# Altium footprint library Integrated Circuits.PcbLib: 142 footprints (part 3 of 9)
Each footprint in its own frame and in the unit in brackets; x right, y up, seen from the top. Pads: shape width x height; smd on the part's side, far side on the other; paste and mask are expansions set on the pad; w line width, h text height; cw(c..) or ccw(c..) is an arc to the next point about the centre after c.
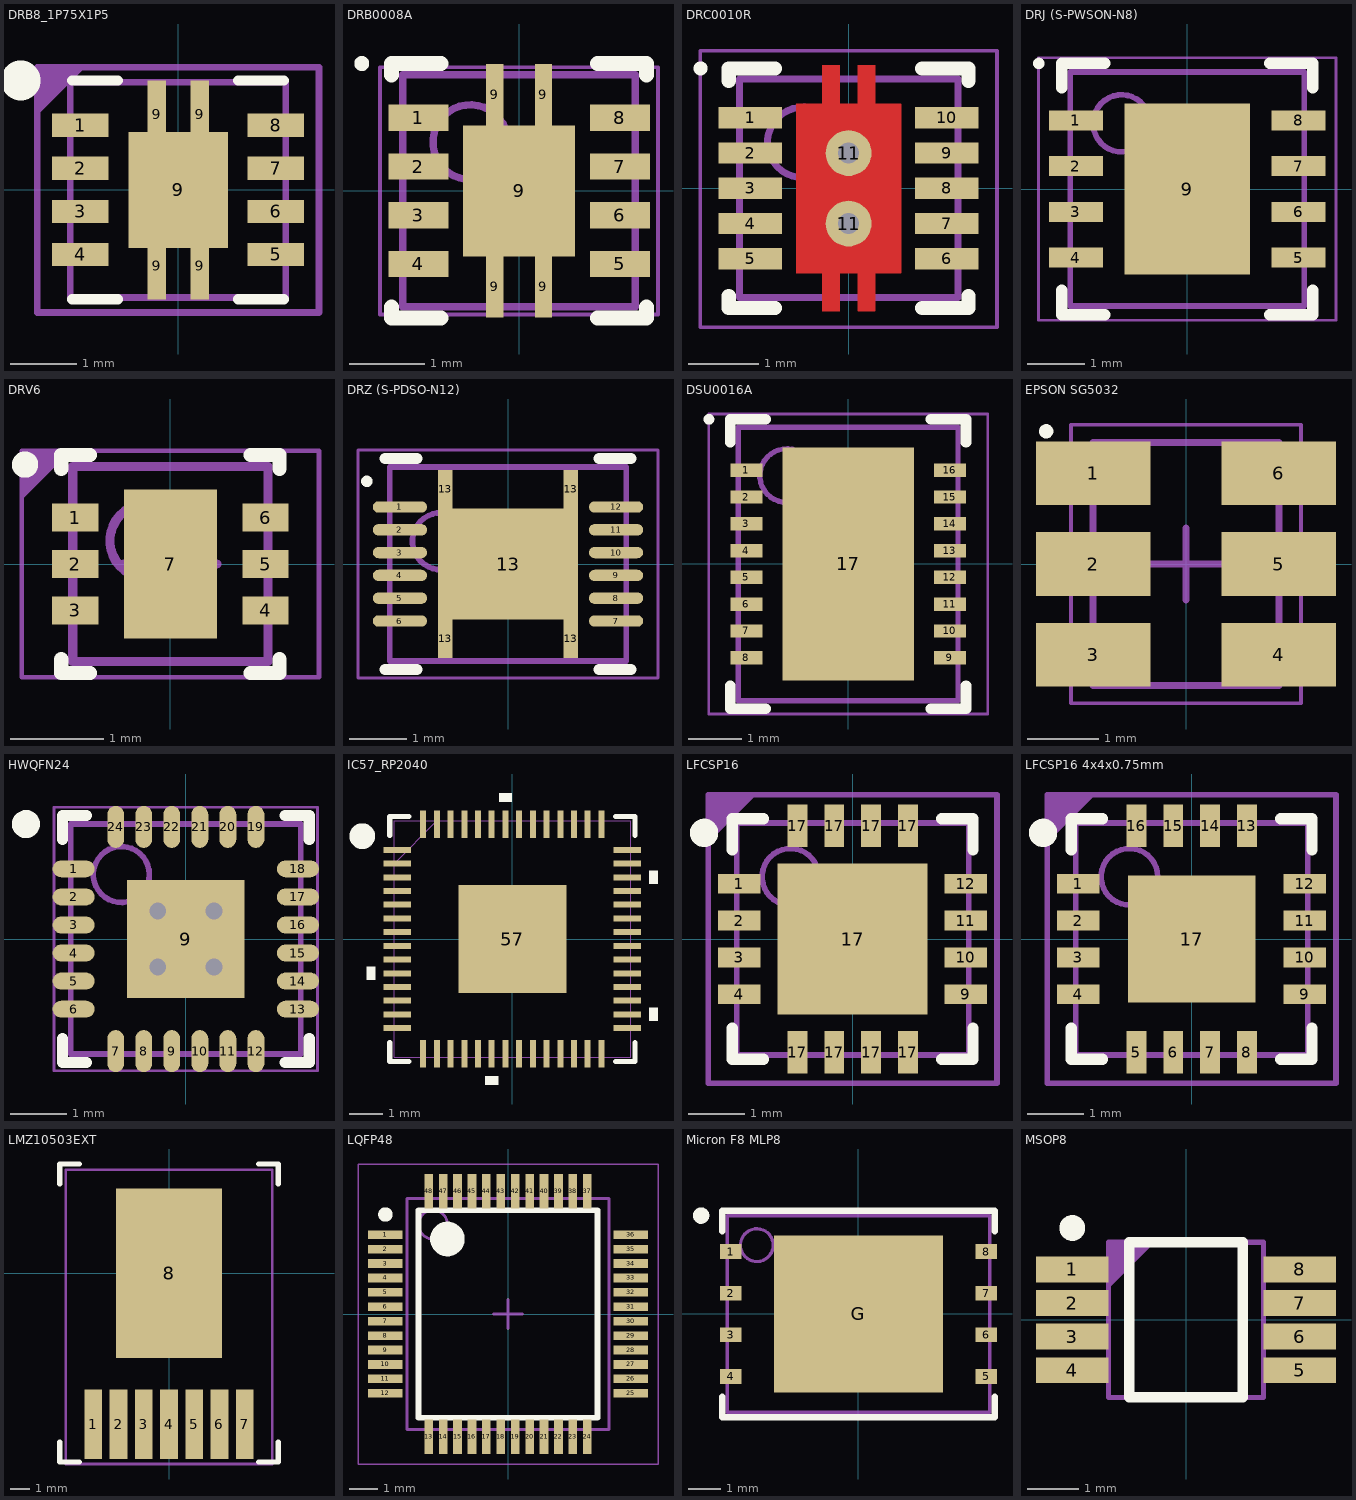
[diagram p2: the footprints below, top view; thin cyan lines are the x and y axes]

## DRB8_1P75X1P5 [mm]
pads (13):
  rect 0.85x0.35 smd: 1(-1.475,0.975) 2(-1.475,0.325) 3(-1.475,-0.325) 4(-1.475,-0.975) 5(1.475,-0.975) 6(1.475,-0.325) 7(1.475,0.325) 8(1.475,0.975)
  rect 0.28x1.016 smd: 9(-0.325,-1.143) 9(-0.325,1.143) 9(0.325,-1.143) 9(0.325,1.143)
  rect 1.5x1.75 smd paste-0.862: 9(0,0)
Top Layer:
  region: 0,-0.875
  region: 0,0.875
Top Overlay:
  circle w0.55: c-2.375,1.65 r0.025
  lines w0.152: -1.6,-1.65 -0.905,-1.65 ; -1.6,1.65 -0.905,1.65 ; 0.905,-1.65 1.6,-1.65 ; 0.905,1.65 1.6,1.65
Top Paste:
  region: 0.675,-0.494 0.241,-0.494 0.1,-0.635 0.1,-0.8 0.675,-0.8
  region: 0.675,0.294 0.241,0.294 0.1,0.152 0.1,-0.152 0.241,-0.294 0.675,-0.294
  region: 0.675,0.8 0.1,0.8 0.1,0.635 0.241,0.494 0.675,0.494
  region: -0.241,-0.494 -0.675,-0.494 -0.675,-0.8 -0.1,-0.8 -0.1,-0.635
  region: -0.241,0.294 -0.675,0.294 -0.675,-0.294 -0.241,-0.294 -0.1,-0.152 -0.1,0.152
  region: -0.1,0.8 -0.675,0.8 -0.675,0.494 -0.241,0.494 -0.1,0.635
  region: 0,-0.875
  region: 0,0.875
Top Solder:
  region: 0,-0.875
  region: 0,0.875
Top Assy Drawing:
  region: -2.125,1.125 -1.375,1.875 -2.125,1.875
  text ".Designator" at -1.956,-0.279 h0.38
3D Bodies:
  lines w0.1: -1.625,-1.625 1.625,-1.625 1.625,1.625 -1.625,1.625 -1.625,-1.625
Mechanical 15:
  lines w0.1: -2.125,-1.85 2.125,-1.85 2.125,1.85 -2.125,1.85 -2.125,-1.85
3D body "QFN65P300X300X100_HS-13N.step": height 1, standoff 0, extent -1.625,-1.625 1.625,1.625

## DRB0008A [mm] "VSON - 1 mm max height"
height 1
pads (13):
  rect 0.8x0.35 smd: 1(-1.345,0.975) 2(-1.345,0.325) 3(-1.345,-0.325) 4(-1.345,-0.975) 5(1.345,-0.975) 6(1.345,-0.325) 7(1.345,0.325) 8(1.345,0.975)
  rect 0.23x0.825 smd: 9(-0.325,-1.28) 9(-0.325,1.28) 9(0.325,-1.28) 9(0.325,1.28)
  rect 1.49x1.75 smd: 9(0,0)
Top Overlay:
  circle w0.1: c-2.1,1.7 r0.05
  lines w0.2: -1.7,-1.55 -1.7,-1.7 -1.045,-1.7 ; -1.7,1.55 -1.7,1.7 -1.045,1.7 ; 1.045,-1.7 1.7,-1.7 1.7,-1.55 ; 1.045,1.7 1.7,1.7 1.7,1.55
3D Bodies:
  circle w0.1: c-0.65,0.65 r0.5
  lines w0.1: -1.55,-1.55 1.55,-1.55 1.55,1.55 -1.55,1.55 -1.55,-1.55
Mechanical 15:
  lines w0.05: -1.855,-1.65 1.855,-1.65 1.855,1.65 -1.855,1.65 -1.855,-1.65
  lines w0.1: -0.5,0 0.5,0 ; 0,-0.5 0,0.5
3D body "SON127P600-8N.step": height 1, standoff 0, extent -1.551,-1.55 1.551,1.55

## DRC0010R [mm]
height 1
pads (12):
  rect 0.9x0.3 smd: 1(-1.395,1) 2(-1.395,0.5) 3(-1.395,0) 4(-1.395,-0.5) 5(-1.395,-1) 6(1.395,-1) 7(1.395,-0.5) 8(1.395,0) 9(1.395,0.5) 10(1.395,1)
  round 0.65 / inner round 1.524 / far side round 0.65 hole 0.3 mask-0.203: 11(0,-0.5) 11(0,0.5)
Top Layer:
  region: -0.745,1.198 0.745,1.198 0.745,-1.202 -0.745,-1.202
  region: -0.375,1.742 -0.125,1.742 -0.125,1.197 -0.375,1.197
  region: 0.13,1.742 0.38,1.742 0.38,1.197 0.13,1.197
  region: -0.375,-1.2 -0.125,-1.2 -0.125,-1.745 -0.375,-1.745
  region: 0.13,-1.2 0.38,-1.2 0.38,-1.745 0.13,-1.745
Top Overlay:
  circle w0.1: c-2.1,1.7 r0.05
  lines w0.2: -1.7,-1.525 -1.7,-1.7 -1.045,-1.7 ; -1.7,1.525 -1.7,1.7 -1.045,1.7 ; 1.045,-1.7 1.7,-1.7 1.7,-1.525 ; 1.045,1.7 1.7,1.7 1.7,1.525
3D Bodies:
  circle w0.1: c-0.65,0.65 r0.5
  lines w0.1: -1.55,-1.55 -1.55,1.55 1.55,1.55 1.55,-1.55 -1.55,-1.55
Mechanical 15:
  lines w0.05: -2.105,-1.97 -2.105,1.95 2.105,1.95 2.105,-1.97 -2.105,-1.97
  lines w0.1: -0.5,0 0.5,0 ; 0,-0.5 0,0.5
3D body: height 1, standoff 0, extent -1.55,-1.55 1.55,1.55

## DRJ (S-PWSON-N8) [mm] "SON, 8-Leads, Body 4.00x4.00mm, Pitch 0.80mm, Thermal Pad 3.00x2.20mm, IPC Medium Density"
height 0.8
pads (9):
  rect 0.95x0.35 smd: 1(-1.95,1.2) 2(-1.95,0.4) 3(-1.95,-0.4) 4(-1.95,-1.2) 5(1.95,-1.2) 6(1.95,-0.4) 7(1.95,0.4) 8(1.95,1.2)
  rect 2.2x3 smd paste-1.1: 9(0,0)
Top Overlay:
  circle w0.1: c-2.6,2.2 r0.05
  lines w0.2: -2.2,-1.775 -2.2,-2.2 -1.445,-2.2 ; -2.2,1.775 -2.2,2.2 -1.445,2.2 ; 1.445,-2.2 2.2,-2.2 2.2,-1.775 ; 1.445,2.2 2.2,2.2 2.2,1.775
Top Paste:
  rectangle: -1,0.1 -0.1,1.4
  rectangle: -1,-1.4 -0.1,-0.1
  rectangle: 0.1,0.1 1,1.4
  rectangle: 0.1,-1.4 1,-0.1
3D Bodies:
  circle w0.1: c-1.15,1.15 r0.5
  lines w0.1: -2.05,-2.05 -2.05,2.05 2.05,2.05 2.05,-2.05 -2.05,-2.05
Mechanical 15:
  lines w0.05: -2.605,-2.3 -2.605,2.3 2.605,2.3 2.605,-2.3 -2.605,-2.3
  lines w0.1: -0.5,0 0.5,0 ; 0,-0.5 0,0.5
3D body "DRJ (S-PWSON-N8).step": height 0.8, standoff 0, extent -2.13,-2.05 2.13,2.05

## DRV6 [mm] "QFN, 6-Leads, Body 2.00x2.00mm, Pitch 0.65mm/0.50mm, Thermal Pad 1.00x1.60mm, IPC Medium Density"
height 0.8
pads (7):
  rect 0.5x0.3 smd: 1(-1.024,0.5) 2(-1.024,0) 3(-1.024,-0.5) 4(1.024,-0.5) 5(1.024,0) 6(1.024,0.5)
  rect 1x1.6 smd paste-1.016: 7(0,0)
Top Overlay:
  lines w0.152: -1.499,1.081 ccw(c-1.564,1.07) -1.499,1.067 ; -1.175,-1.025 -1.175,-1.175 -0.864,-1.175 ; -1.175,1.025 -1.175,1.175 -0.864,1.175 ; 0.864,-1.175 1.175,-1.175 1.175,-1.025 ; 0.864,1.175 1.175,1.175 1.175,1.025
Top Paste:
  region: -0.4,0.7 -0.05,0.7 -0.05,0.05 -0.4,0.05
  region: 0.4,-0.7 0.05,-0.7 0.05,-0.05 0.4,-0.05
  region: -0.4,-0.7 -0.05,-0.7 -0.05,-0.05 -0.4,-0.05
  region: 0.4,0.7 0.05,0.7 0.05,0.05 0.4,0.05
Top Assy Drawing:
  region: -1.622,0.668 -1.07,1.219 -1.622,1.219
  lines w0.05: -1.6,-1.219 -1.6,1.219 1.6,1.219 1.6,-1.219 -1.6,-1.219
  lines w0.1: -0.5,0 0.5,0 ; 0,-0.5 0,0.5
  text ".Designator" at -1.956,-0.279 h0.38
Top Dimensions and Assy Info:
  circle w0.1: c-0.25,0.25 r0.4
  lines w0.1: -1.05,-1.05 -1.05,1.05 1.05,1.05 1.05,-1.05 -1.05,-1.05
3D body "QFN50P200X200X80_HS-7N.step": height 0.8, standoff 0, extent -1.1,-1.05 1.1,1.05

## DRZ (S-PDSO-N12) [mm] "SON, 12-Leads, Body 2.50x4.00mm, Pitch 0.40mm, Thermal Pad 2.45x1.95mm, IPC Medium Density"
height 1
pads (17):
  oval 0.95x0.2 smd: 1(-1.895,1) 2(-1.895,0.6) 3(-1.895,0.2) 4(-1.895,-0.2) 5(-1.895,-0.6) 6(-1.895,-1) 7(1.895,-1) 8(1.895,-0.6) 9(1.895,-0.2) 10(1.895,0.2) 11(1.895,0.6) 12(1.895,1)
  rect 0.25x0.675 smd: 13(-1.1,-1.31) 13(-1.1,1.31) 13(1.1,-1.31) 13(1.1,1.31)
  rect 2.45x1.95 smd: 13(0,0)
Top Overlay:
  circle w0.1: c-2.475,1.45 r0.05
  lines w0.2: -2.155,-1.85 -1.6,-1.85 ; -2.155,1.85 -1.6,1.85 ; 1.595,-1.85 2.15,-1.85 ; 1.595,1.85 2.15,1.85
3D Bodies:
  circle w0.1: c-1.175,0.4 r0.5
  lines w0.1: -2.075,-1.7 2.075,-1.7 2.075,1.7 -2.075,1.7 -2.075,-1.7
Mechanical 15:
  lines w0.05: -2.63,-2 2.63,-2 2.63,2 -2.63,2 -2.63,-2
  lines w0.1: -0.5,0 0.5,0 ; 0,-0.5 0,0.5

## DSU0016A [mm] "SON, 16-Leads, Body 5.00x4.00mm, Pitch 0.50mm, Thermal Pad 4.35x2.45mm, IPC Medium Density"
height 1
pads (17):
  rect 0.6x0.25 smd: 1(-1.9,1.75) 2(-1.9,1.25) 3(-1.9,0.75) 4(-1.9,0.25) 5(-1.9,-0.25) 6(-1.9,-0.75) 7(-1.9,-1.25) 8(-1.9,-1.75) 9(1.9,-1.75) 10(1.9,-1.25) 11(1.9,-0.75) 12(1.9,-0.25) 13(1.9,0.25) 14(1.9,0.75) 15(1.9,1.25) 16(1.9,1.75)
  rect 2.45x4.35 smd paste-1.225: 17(0,0)
Top Overlay:
  circle w0.1: c-2.6,2.7 r0.05
  lines w0.2: -2.2,-2.275 -2.2,-2.7 -1.545,-2.7 ; -2.2,2.275 -2.2,2.7 -1.545,2.7 ; 1.545,-2.7 2.2,-2.7 2.2,-2.275 ; 1.545,2.7 2.2,2.7 2.2,2.275
Top Paste:
  rectangle: 0.1,-2.075 1.13,-0.825
  rectangle: 0.1,-0.625 1.13,0.625
  rectangle: 0.1,0.825 1.13,2.075
  rectangle: -1.13,-2.075 -0.1,-0.825
  rectangle: -1.13,-0.625 -0.1,0.625
  rectangle: -1.13,0.825 -0.1,2.075
3D Bodies:
  circle w0.1: c-1.15,1.65 r0.5
  lines w0.1: -2.05,-2.55 2.05,-2.55 2.05,2.55 -2.05,2.55 -2.05,-2.55
Mechanical 15:
  lines w0.05: -2.605,-2.8 2.605,-2.8 2.605,2.8 -2.605,2.8 -2.605,-2.8
  lines w0.1: -0.5,0 0.5,0 ; 0,-0.5 0,0.5
3D body: height 1, standoff 0.05, extent -2.05,-2.55 2.05,2.55

## EPSON SG5032 [mm] "EPSON SG5032 XTAL"
height 1
pads (6):
  rect 1.6x0.89 smd: 1(-1.3,1.27) 2(-1.3,0) 3(-1.3,-1.27) 4(1.3,-1.27) 5(1.3,0) 6(1.3,1.27)
Top Overlay:
  circle w0.1: c-1.957,1.858 r0.05
3D Bodies:
  lines w0.1: -1.3,-1.7 1.3,-1.7 1.3,-1.59 cw(c1.3,-1.27) 1.3,-0.95 1.3,-0.32 cw(c1.3,0) 1.3,0.32 1.3,0.95 cw(c1.3,1.27) 1.3,1.59 1.3,1.7 -1.3,1.7 -1.3,1.59 cw(c-1.3,1.27) -1.3,0.95 -1.3,0.32 cw(c-1.3,0) -1.3,-0.32 -1.3,-0.95 cw(c-1.3,-1.27) -1.3,-1.59 -1.3,-1.7
Mechanical 15:
  lines w0.05: -1.61,-1.95 1.61,-1.95 1.61,1.95 -1.61,1.95 -1.61,-1.95
  lines w0.1: -0.5,0 0.5,0 ; 0,-0.5 0,0.5
3D body "Raltron CL3225 v15.step": height 1.22, standoff 0, extent -1.25,-1.6 1.25,1.6

## HWQFN24 [mm] "QFN, 24-Leads, Body 4.00x4.00mm, Pitch 0.50mm, Thermal Pad 2.10x2.10mm, IPC High Density"
height 0.8
pads (25):
  oval 0.75x0.3 smd: 1(-2,1.25) 2(-2,0.75) 3(-2,0.25) 4(-2,-0.25) 5(-2,-0.75) 6(-2,-1.25) 13(2,-1.25) 14(2,-0.75) 15(2,-0.25) 16(2,0.25) 17(2,0.75) 18(2,1.25)
  oval 0.3x0.75 smd: 7(-1.25,-2) 8(-0.75,-2) 9(-0.25,-2) 10(0.25,-2) 11(0.75,-2) 12(1.25,-2) 19(1.25,2) 20(0.75,2) 21(0.25,2) 22(-0.25,2) 23(-0.75,2) 24(-1.25,2)
  rect 2.1x2.1 smd: 9(0,0)
via 0.5,-0.5 diameter 0.6 hole 0.3
via -0.5,-0.5 diameter 0.6 hole 0.3
via 0.5,0.5 diameter 0.6 hole 0.3
via -0.5,0.5 diameter 0.6 hole 0.3
Top Overlay:
  circle w0.25: c-2.85,2.05 r0.125
  lines w0.2: -2.2,-1.775 -2.2,-2.2 -1.775,-2.2 ; -2.2,1.775 -2.2,2.2 -1.775,2.2 ; 1.775,-2.2 2.2,-2.2 2.2,-1.775 ; 1.775,2.2 2.2,2.2 2.2,1.775
3D Bodies:
  circle w0.1: c-1.15,1.15 r0.5
  lines w0.1: -2.05,-2.05 2.05,-2.05 2.05,2.05 -2.05,2.05 -2.05,-2.05
Mechanical 15:
  lines w0.05: -2.35,-2.35 2.35,-2.35 2.35,2.35 -2.35,2.35 -2.35,-2.35
  lines w0.1: -0.5,0 0.5,0 ; 0,-0.5 0,0.5
3D body "CP-24-10.step": height 0.8, standoff 0, extent -2.07,-2.07 2.07,2.07

## IC57_RP2040 [mil]
pads (57):
  rect 32x7 smd paste+0 mask+0: 1(-134,104) 2(-134,88) 3(-134,72) 4(-134,56) 5(-134,40) 6(-134,24) 7(-134,8) 8(-134,-8) 9(-134,-24) 10(-134,-40) 11(-134,-56) 12(-134,-72) 13(-134,-88) 14(-134,-104) 29(134,-104) 30(134,-88) 31(134,-72) 32(134,-56) 33(134,-40) 34(134,-24) 35(134,-8) 36(134,8) 37(134,24) 38(134,40) 39(134,56) 40(134,72) 41(134,88) 42(134,104)
  rect 7x32 smd paste+0 mask+0: 15(-104,-134) 16(-88,-134) 17(-72,-134) 18(-56,-134) 19(-40,-134) 20(-24,-134) 21(-8,-134) 22(8,-134) 23(24,-134) 24(40,-134) 25(56,-134) 26(72,-134) 27(88,-134) 28(104,-134) 43(104,134) 44(88,134) 45(72,134) 46(56,134) 47(40,134) 48(24,134) 49(8,134) 50(-8,134) 51(-24,134) 52(-40,134) 53(-56,134) 54(-72,134) 55(-88,134) 56(-104,134)
  rect 126x126 smd paste-62.5 mask+0: 57(0,0)
Top Overlay:
  circle w20: c-175,120 r5
  region: -0.5,160 -15.5,160 -15.5,170 -0.5,170
  region: 160,79.5 170,79.5 170,64.5 160,64.5
  region: 160,-80.5 170,-80.5 170,-95.5 160,-95.5
  region: -16.5,-160 -31.5,-160 -31.5,-170 -16.5,-170
  region: -160,-32.5 -170,-32.5 -170,-47.5 -160,-47.5
  lines w6: -143,-120.6 -143,-143 -120.6,-143 ; -143,120.6 -143,143 -120.6,143 ; 120.6,-143 143,-143 143,-120.6 ; 120.6,143 143,143 143,120.6
Top Paste:
  region: 59.06,-3.94 3.94,-3.94 3.94,-59.06 59.06,-59.06
  region: 59.06,59.06 3.94,59.06 3.94,3.94 59.06,3.94
  region: -3.94,-3.94 -59.06,-3.94 -59.06,-59.06 -3.94,-59.06
  region: -3.94,59.06 -59.06,59.06 -59.06,3.94 -3.94,3.94
3D Bodies:
  lines w1: -138,88 -88,138 ; -138,-138 -138,138 138,138 138,-138 -138,-138 ; -138,-108.5 -138,-99.5 -138,-108.5 ; -138,-92.5 -138,-83.5 -138,-92.5 ; -138,-76.5 -138,-67.5 -138,-76.5 ; -138,-60.5 -138,-51.5 -138,-60.5 ; -138,-44.5 -138,-35.5 -138,-44.5 ; -138,-28.5 -138,-19.5 -138,-28.5 ; -138,-12.5 -138,-3.5 -138,-12.5 ; -138,3.5 -138,12.5 -138,3.5 ; -138,19.5 -138,28.5 -138,19.5 ; -138,35.5 -138,44.5 -138,35.5 ; -138,51.5 -138,60.5 -138,51.5 ; -138,67.5 -138,76.5 -138,67.5 ; -138,83.5 -138,92.5 -138,83.5 ; -138,99.5 -138,108.5 -138,99.5 ; -108.5,-138 -99.5,-138 -108.5,-138 ; -108.5,138 -99.5,138 -108.5,138 ; -92.5,-138 -83.5,-138 -92.5,-138 ; -92.5,138 -83.5,138 -92.5,138 ; -76.5,-138 -67.5,-138 -76.5,-138 ; -76.5,138 -67.5,138 -76.5,138 ; -60.5,-138 -51.5,-138 -60.5,-138 ; -60.5,138 -51.5,138 -60.5,138 ; -44.5,-138 -35.5,-138 -44.5,-138 ; -44.5,138 -35.5,138 -44.5,138 ; -28.5,-138 -19.5,-138 -28.5,-138 ; -28.5,138 -19.5,138 -28.5,138 ; -12.5,-138 -3.5,-138 -12.5,-138 ; -12.5,138 -3.5,138 -12.5,138 ; 3.5,-138 12.5,-138 3.5,-138 ; 3.5,138 12.5,138 3.5,138 ; 19.5,-138 28.5,-138 19.5,-138 ; 19.5,138 28.5,138 19.5,138 ; 35.5,-138 44.5,-138 35.5,-138 ; 35.5,138 44.5,138 35.5,138 ; 51.5,-138 60.5,-138 51.5,-138 ; 51.5,138 60.5,138 51.5,138 ; 67.5,-138 76.5,-138 67.5,-138 ; 67.5,138 76.5,138 67.5,138 ; 83.5,-138 92.5,-138 83.5,-138 ; 83.5,138 92.5,138 83.5,138 ; 99.5,-138 108.5,-138 99.5,-138 ; 99.5,138 108.5,138 99.5,138 ; 138,-108.5 138,-99.5 138,-108.5 ; 138,-92.5 138,-83.5 138,-92.5 ; 138,-76.5 138,-67.5 138,-76.5 ; 138,-60.5 138,-51.5 138,-60.5 ; 138,-44.5 138,-35.5 138,-44.5 ; 138,-28.5 138,-19.5 138,-28.5 ; 138,-12.5 138,-3.5 138,-12.5 ; 138,3.5 138,12.5 138,3.5 ; 138,19.5 138,28.5 138,19.5 ; 138,35.5 138,44.5 138,35.5 ; 138,51.5 138,60.5 138,51.5 ; 138,67.5 138,76.5 138,67.5 ; 138,83.5 138,92.5 138,83.5 ; 138,99.5 138,108.5 138,99.5
  text "*" at -130.5,87 h50
3D body "RP2040_QFN_PACKAGE v3.step": height 39.37, standoff 0, extent -138.19,-138.19 138.19,138.19

## LFCSP16 [mm]
pads (17):
  rect 0.75x0.35 smd: 1(-2,0.975) 2(-2,0.325) 3(-2,-0.325) 4(-2,-0.975) 9(2,-0.975) 10(2,-0.325) 11(2,0.325) 12(2,0.975)
  rect 0.35x0.75 smd: 17(-0.975,-2) 17(-0.975,2) 17(-0.325,-2) 17(-0.325,2) 17(0.325,-2) 17(0.325,2) 17(0.975,-2) 17(0.975,2)
  rect 2.65x2.66 smd paste-1.3: 17(0,0)
Top Overlay:
  circle w0.25: c-2.625,1.875 r0.125
  lines w0.2: -2.125,-1.575 -2.125,-2.125 -1.575,-2.125 ; -2.125,1.575 -2.125,2.125 -1.575,2.125 ; 1.575,-2.125 2.125,-2.125 2.125,-1.575 ; 1.575,2.125 2.125,2.125 2.125,1.575
Top Paste:
  region: -1.225,-0.15 -0.15,-0.15 -0.15,-1.225 -1.225,-1.225
  region: 0.15,-0.15 1.225,-0.15 1.225,-1.225 0.15,-1.225
  region: 0.15,1.225 1.225,1.225 1.225,0.15 0.15,0.15
  region: -1.225,1.225 -0.15,1.225 -0.15,0.15 -1.225,0.15
Top Assy Drawing:
  region: -2.5,1.75 -1.75,2.5 -2.5,2.5
  text ".Designator" at -1.956,-0.279 h0.38
3D Bodies:
  circle w0.1: c-1.1,1.1 r0.5
  lines w0.1: -2.05,-2.05 -2.05,2.05 2.05,2.05 2.05,-2.05 -2.05,-2.05
Mechanical 15:
  lines w0.1: -0.5,0 0.5,0 ; 0,-0.5 0,0.5 ; -2.55,-2.55 -2.55,2.55 2.55,2.55 2.55,-2.55 -2.55,-2.55
3D body "QFN65P400X400X80_HS-17N.step": height 0.8, standoff 0, extent -2.07,-2.07 2.07,2.07

## LFCSP16 4x4x0.75mm [mm] "16-Lead Lead Frame Chip Scale Package"
height 0.75
pads (17):
  rect 0.75x0.35 smd: 1(-2,0.975) 2(-2,0.325) 3(-2,-0.325) 4(-2,-0.975) 9(2,-0.975) 10(2,-0.325) 11(2,0.325) 12(2,0.975)
  rect 0.35x0.75 smd: 5(-0.975,-2) 6(-0.325,-2) 7(0.325,-2) 8(0.975,-2) 13(0.975,2) 14(0.325,2) 15(-0.325,2) 16(-0.975,2)
  rect 2.25x2.25 smd paste-1.3: 17(0,0)
Top Overlay:
  circle w0.25: c-2.625,1.875 r0.125
  lines w0.2: -2.125,-1.575 -2.125,-2.125 -1.575,-2.125 ; -2.125,1.575 -2.125,2.125 -1.575,2.125 ; 1.575,-2.125 2.125,-2.125 2.125,-1.575 ; 1.575,2.125 2.125,2.125 2.125,1.575
Top Paste:
  region: -1.122,1.125 -0.047,1.125 -0.047,0.05 -1.122,0.05
  region: -1.125,-1.122 -1.125,-0.047 -0.05,-0.047 -0.05,-1.122
  region: 1.122,-1.125 0.047,-1.125 0.047,-0.05 1.122,-0.05
  region: 1.125,1.122 1.125,0.047 0.05,0.047 0.05,1.122
Top Assy Drawing:
  region: -2.5,1.75 -1.75,2.5 -2.5,2.5
  text ".Designator" at -1.956,-0.279 h0.38
3D Bodies:
  circle w0.1: c-1.1,1.1 r0.5
  lines w0.1: -2.05,-2.05 2.05,-2.05 2.05,2.05 -2.05,2.05 -2.05,-2.05
Mechanical 15:
  lines w0.1: -0.5,0 0.5,0 ; 0,-0.5 0,0.5 ; -2.55,-2.55 2.55,-2.55 2.55,2.55 -2.55,2.55 -2.55,-2.55
3D body "QFN65P400X400X80_HS-17N.step": height 0.8, standoff 0, extent -2.07,-2.07 2.07,2.07

## LMZ10503EXT [mm] "IC BUCK SYNC ADJ 3A TO-PMOD-7"
height 4.6
pads (8):
  rect 0.89x3.5 smd: 1(-3.81,-7.6) 2(-2.54,-7.6) 3(-1.27,-7.6) 4(0,-7.6) 5(1.27,-7.6) 6(2.54,-7.6) 7(3.81,-7.6)
  rect 5.35x8.54 smd: 8(0,0)
Top Overlay:
  lines w0.254: -5.5,-8.5 -5.5,-9.5 -4.5,-9.5 ; -5.5,4.5 -5.5,5.5 -4.5,5.5 ; 4.5,-9.5 5.5,-9.5 5.5,-8.5 ; 4.5,5.5 5.5,5.5 5.5,4.5
Mechanical 15:
  lines w0.127: -5.2,-9.6 -5.2,5.2 5.2,5.2 5.2,-9.6 -5.2,-9.6
3D body "LMZ10503EXT.step": height 4.57, standoff 0, extent -5.08,-8.745 5.08,5.025

## LQFP48 [mm] "TSQFP, 48-Leads, Body 7.00x8.00mm, Pitch 0.50mm, IPC Medium Density"
height 1.6
pads (48):
  rect 1.2x0.3 smd: 1(-4.25,2.75) 2(-4.25,2.25) 3(-4.25,1.75) 4(-4.25,1.25) 5(-4.25,0.75) 6(-4.25,0.25) 7(-4.25,-0.25) 8(-4.25,-0.75) 9(-4.25,-1.25) 10(-4.25,-1.75) 11(-4.25,-2.25) 12(-4.25,-2.75) 25(4.25,-2.75) 26(4.25,-2.25) 27(4.25,-1.75) 28(4.25,-1.25) 29(4.25,-0.75) 30(4.25,-0.25) 31(4.25,0.25) 32(4.25,0.75) 33(4.25,1.25) 34(4.25,1.75) 35(4.25,2.25) 36(4.25,2.75)
  rect 0.3x1.2 smd: 13(-2.75,-4.25) 14(-2.25,-4.25) 15(-1.75,-4.25) 16(-1.25,-4.25) 17(-0.75,-4.25) 18(-0.25,-4.25) 19(0.25,-4.25) 20(0.75,-4.25) 21(1.25,-4.25) 22(1.75,-4.25) 23(2.25,-4.25) 24(2.75,-4.25) 37(2.75,4.25) 38(2.25,4.25) 39(1.75,4.25) 40(1.25,4.25) 41(0.75,4.25) 42(0.25,4.25) 43(-0.25,4.25) 44(-0.75,4.25) 45(-1.25,4.25) 46(-1.75,4.25) 47(-2.25,4.25) 48(-2.75,4.25)
Top Overlay:
  circle w0.25: c-4.25,3.45 r0.125
  circle w0.6: c-2.1,2.6 r0.3
  lines w0.2: -3.1,-3.6 -3.1,3.6 3.1,3.6 3.1,-3.6 -3.1,-3.6
3D Bodies:
  circle w0.1: c-2.6,3.1 r0.5
  lines w0.1: -3.5,-4 -3.5,4 3.5,4 3.5,-4 -3.5,-4
Mechanical 15:
  lines w0.05: -5.2,-5.2 -5.2,5.2 5.2,5.2 5.2,-5.2 -5.2,-5.2
  lines w0.1: -0.5,0 0.5,0 ; 0,-0.5 0,0.5
3D body "LQFP48.STEP": height 1.5, standoff 0, extent -4.513,-4.513 4.513,4.513

## Micron F8 MLP8 [mm] "QFN, 8-Leads, Body 8.00x6.00mm, Pitch 1.27mm, Thermal Pad 5.16x4.80mm, IPC High Density"
height 1
pads (9):
  rect 0.65x0.45 smd: 1(-3.9,1.905) 2(-3.9,0.635) 3(-3.9,-0.635) 4(-3.9,-1.905) 5(3.9,-1.905) 6(3.9,-0.635) 7(3.9,0.635) 8(3.9,1.905)
  rect 5.16x4.8 smd: G(0,0)
Top Overlay:
  circle w0.25: c-4.8,3 r0.125
  lines w0.2: -4.15,-2.53 -4.15,-3.15 0.01,-3.15 ; -4.15,2.53 -4.15,3.15 0.01,3.15 ; -0.01,-3.15 4.15,-3.15 4.15,-2.53 ; -0.01,3.15 4.15,3.15 4.15,2.53
Top Assy Drawing:
  circle w0.1: c-3.1,2.1 r0.5
  lines w0.1: -4,-3 4,-3 4,3 -4,3 -4,-3
  text ".Designator" at -5,-0.8 h0.76
3D body "Micron F8 MLP8.step": height 1, standoff 0, extent -4.05,-3 4.05,3

## MSOP8 [mm] "TSOP, 8-Leads, Body 3.00x3.00mm, Pitch 0.65mm, IPC Medium Density"
height 1.1
pads (8):
  rect 1.4x0.5 smd: 1(-2.2,0.975) 2(-2.2,0.325) 3(-2.2,-0.325) 4(-2.2,-0.975) 5(2.2,-0.975) 6(2.2,-0.325) 7(2.2,0.325) 8(2.2,0.975)
Top Overlay:
  circle w0.25: c-2.2,1.775 r0.125
  lines w0.2: -1.1,-1.5 -1.1,1.5 1.1,1.5 1.1,-1.5 -1.1,-1.5
Top Assy Drawing:
  region: -1.5,0.6 -0.6,1.5 -1.5,1.5
  lines w0.1: -1.5,-1.5 -1.5,1.5 1.5,1.5 1.5,-1.5 -1.5,-1.5
3D body "MSOP8.step": height 1.1, standoff 0, extent -2.45,-1.5 2.45,1.5